# Altium footprint library GNSS.PcbLib: 2 footprints
Each footprint in its own frame and in the unit in brackets; x right, y up, seen from the top. Pads: shape width x height; smd on the part's side, far side on the other; paste and mask are expansions set on the pad; w line width, h text height; cw(c..) or ccw(c..) is an arc to the next point about the centre after c.
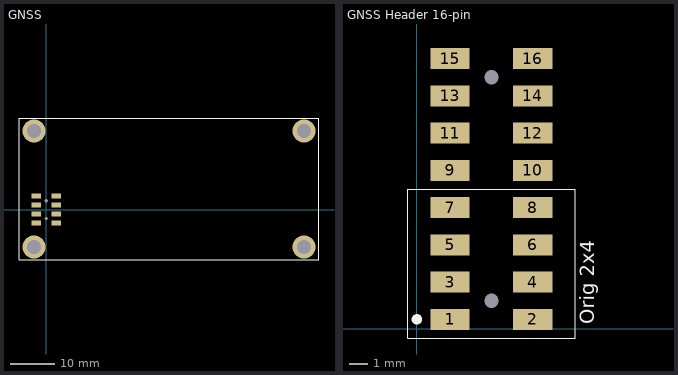
[diagram p0: the footprints below, top view; thin cyan lines are the x and y axes]

## GNSS [mm]
pads (10):
  round 0 hole 0.76: 0(0,-2) 0(0,2)
  rect 2.105x1.12 smd: 1(-2.222,-3) 2(2.223,-3) 3(-2.222,-1) 4(2.223,-1) 5(-2.222,1) 6(2.223,1) 7(-2.222,3) 8(2.223,3)
via -2.77,17.595 diameter 5.08 hole 3.099
via 57.73,-8.405 diameter 5.08 hole 3.099
via 57.73,17.595 diameter 5.08 hole 3.099
via -2.77,-8.405 diameter 5.08 hole 3.099
Top Overlay:
  lines w0.254: -6.11,-11.28 -6.11,20.47 61.07,20.47 61.07,-11.28 -6.11,-11.28
3D body "TLE-104-01-G-DV.stp": height 4.32, standoff -0.18, extent -2.781,-3.848 2.781,4.148
3D body "RCB-F9T(AP214).STEP": height 9.68, standoff 0.04, extent -6.072,-11.091 66.313,20.662

## GNSS Header 16-pin [mm]
pads (18):
  round 0 hole 0.76: 0(4,1.5) 0(4,13.5)
  rect 2.105x1.12 smd: 1(1.778,0.5) 2(6.223,0.5) 3(1.778,2.5) 4(6.223,2.5) 5(1.778,4.5) 6(6.223,4.5) 7(1.778,6.5) 8(6.223,6.5) 9(1.778,8.5) 10(6.223,8.5) 11(1.778,10.5) 12(6.223,10.5) 13(1.778,12.5) 14(6.223,12.5) 15(1.778,14.5) 16(6.223,14.5)
Top Overlay:
  circle w0.508: c0,0.5 r0.025
  lines w0.025: -0.5,-0.5 8.5,-0.5 8.5,7.5 -0.5,7.5 -0.5,-0.5
  text "Orig 2x4" at 9.517,0.229 h0.76